# Altium footprint library ADP_SMT.PcbLib: 204 footprints (part 3 of 15)
Each footprint in its own frame and in the unit in brackets; x right, y up, seen from the top. Pads: shape width x height; smd on the part's side, far side on the other; paste and mask are expansions set on the pad; w line width, h text height; cw(c..) or ccw(c..) is an arc to the next point about the centre after c.
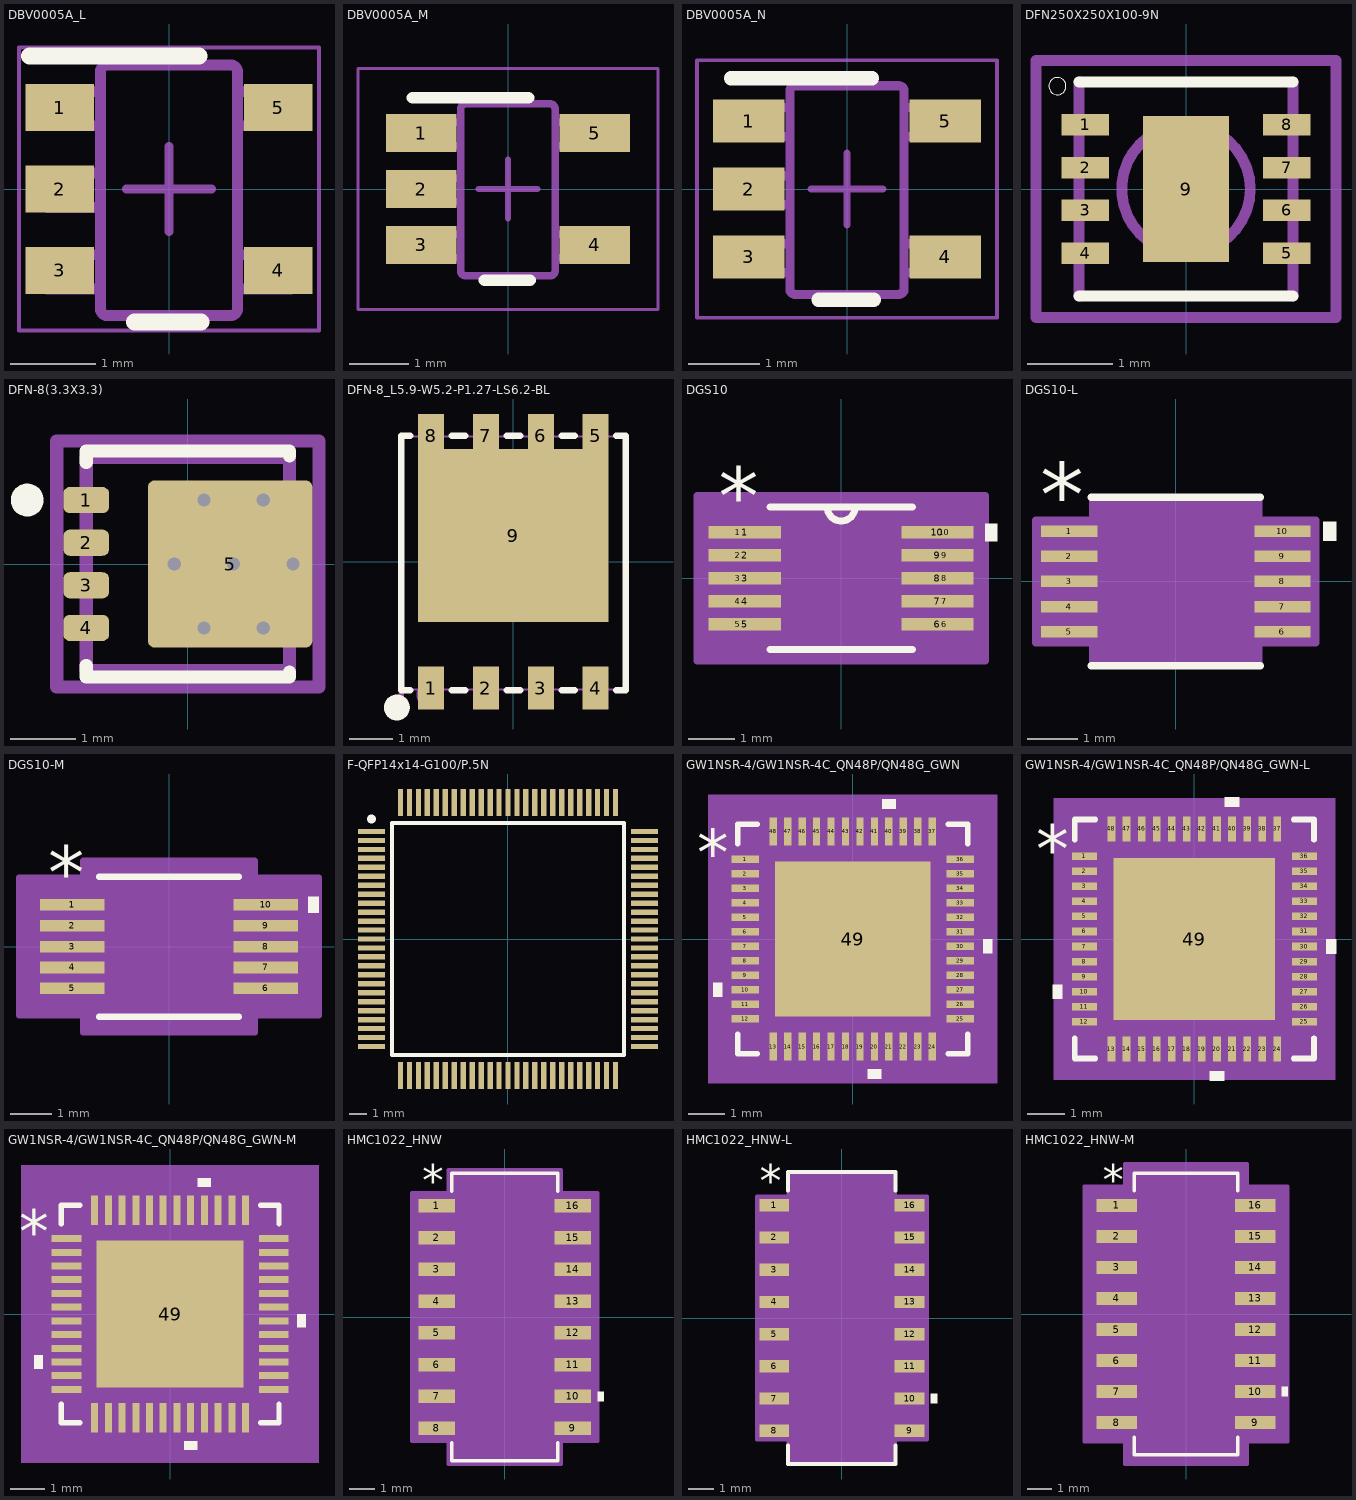
[diagram p2: the footprints below, top view; thin cyan lines are the x and y axes]

## DBV0005A_L [mm]
pads (5):
  rect 0.8x0.55 smd paste+0 mask+0.051: 1(-1.275,0.95) 2(-1.275,0) 3(-1.275,-0.95) 4(1.275,-0.95) 5(1.275,0.95)
Top Overlay:
  lines w0.2: -1.625,1.55 0.35,1.55 ; -0.4,-1.55 0.375,-1.55
Mechanical 13:
  lines w0.127: -0.801,1.371 cw(c-0.725,1.37) -0.725,1.446 ; -0.801,1.37 -0.801,-1.399 -0.801,-1.4 ccw(c-0.725,-1.399) -0.725,-1.475 ; -0.801,1.37 -0.801,1.371 ; -0.725,-1.475 -0.725,-1.475 ; -0.725,-1.475 0.723,-1.475 0.724,-1.475 ccw(c0.723,-1.399) 0.799,-1.4 0.799,-1.399 0.799,1.37 ; -0.725,1.446 0.723,1.446 0.724,1.446 cw(c0.723,1.37) 0.799,1.371 ; -0.725,1.446 -0.725,1.446 ; 0.799,1.37 0.799,1.371 ; -1.423,-1.167 -1.199,-1.167 -1.105,-1.167 -1.088,-1.167 -0.835,-1.167 -0.801,-1.167 -0.801,-0.767 -0.835,-0.767 -1.088,-0.767 -1.105,-0.767 -1.199,-0.767 -1.423,-0.767 -1.423,-1.167 ; -1.423,-0.215 -1.199,-0.215 -1.105,-0.215 -1.088,-0.215 -0.835,-0.215 -0.801,-0.215 -0.801,0.186 -0.835,0.186 -1.088,0.186 -1.105,0.186 -1.199,0.186 -1.423,0.186 -1.423,-0.215 ; -1.423,0.738 -1.199,0.738 -1.105,0.738 -1.088,0.738 -0.835,0.738 -0.801,0.738 -0.801,1.138 -0.835,1.138 -1.088,1.138 -1.105,1.138 -1.199,1.138 -1.423,1.138 -1.423,0.738 ; 0.799,-1.167 0.799,-0.767 0.834,-0.767 1.087,-0.767 1.103,-0.767 1.198,-0.767 1.422,-0.767 1.422,-1.167 1.198,-1.167 1.103,-1.167 1.087,-1.167 0.834,-1.167 0.799,-1.167 ; 0.799,0.738 0.799,1.138 0.834,1.138 1.087,1.138 1.103,1.138 1.198,1.138 1.422,1.138 1.422,0.738 1.198,0.738 1.103,0.738 1.087,0.738 0.834,0.738 0.799,0.738
Mechanical 15:
  lines w0.05: -1.75,-1.65 -1.75,1.65 1.75,1.65 1.75,-1.65 -1.75,-1.65
  lines w0.1: -0.5,0 0.5,0 ; 0,-0.5 0,0.5
3D body: height 0.25, standoff 0, extent 0,0 0.254,0.254

## DBV0005A_M [mm]
pads (5):
  rect 1.2x0.65 smd paste+0 mask+0.051: 1(-1.475,0.95) 2(-1.475,0) 3(-1.475,-0.95) 4(1.475,-0.95) 5(1.475,0.95)
Top Overlay:
  lines w0.2: -1.625,1.55 0.35,1.55 ; -0.4,-1.55 0.375,-1.55
Mechanical 13:
  lines w0.127: -0.801,1.371 cw(c-0.725,1.37) -0.725,1.446 ; -0.801,1.37 -0.801,-1.399 -0.801,-1.4 ccw(c-0.725,-1.399) -0.725,-1.475 ; -0.801,1.37 -0.801,1.371 ; -0.725,-1.475 -0.725,-1.475 ; -0.725,-1.475 0.723,-1.475 0.724,-1.475 ccw(c0.723,-1.399) 0.799,-1.4 0.799,-1.399 0.799,1.37 ; -0.725,1.446 0.723,1.446 0.724,1.446 cw(c0.723,1.37) 0.799,1.371 ; -0.725,1.446 -0.725,1.446 ; 0.799,1.37 0.799,1.371 ; -1.423,-1.167 -1.199,-1.167 -1.105,-1.167 -1.088,-1.167 -0.835,-1.167 -0.801,-1.167 -0.801,-0.767 -0.835,-0.767 -1.088,-0.767 -1.105,-0.767 -1.199,-0.767 -1.423,-0.767 -1.423,-1.167 ; -1.423,-0.215 -1.199,-0.215 -1.105,-0.215 -1.088,-0.215 -0.835,-0.215 -0.801,-0.215 -0.801,0.186 -0.835,0.186 -1.088,0.186 -1.105,0.186 -1.199,0.186 -1.423,0.186 -1.423,-0.215 ; -1.423,0.738 -1.199,0.738 -1.105,0.738 -1.088,0.738 -0.835,0.738 -0.801,0.738 -0.801,1.138 -0.835,1.138 -1.088,1.138 -1.105,1.138 -1.199,1.138 -1.423,1.138 -1.423,0.738 ; 0.799,-1.167 0.799,-0.767 0.834,-0.767 1.087,-0.767 1.103,-0.767 1.198,-0.767 1.422,-0.767 1.422,-1.167 1.198,-1.167 1.103,-1.167 1.087,-1.167 0.834,-1.167 0.799,-1.167 ; 0.799,0.738 0.799,1.138 0.834,1.138 1.087,1.138 1.103,1.138 1.198,1.138 1.422,1.138 1.422,0.738 1.198,0.738 1.103,0.738 1.087,0.738 0.834,0.738 0.799,0.738
Mechanical 15:
  lines w0.05: -2.55,-2.05 -2.55,2.05 2.55,2.05 2.55,-2.05 -2.55,-2.05
  lines w0.1: -0.5,0 0.5,0 ; 0,-0.5 0,0.5
3D body: height 0.25, standoff 0, extent 0,0 0.254,0.254

## DBV0005A_N [mm]
pads (5):
  rect 1x0.6 smd paste+0 mask+0.051: 1(-1.375,0.95) 2(-1.375,0) 3(-1.375,-0.95) 4(1.375,-0.95) 5(1.375,0.95)
Top Overlay:
  lines w0.2: -1.625,1.55 0.35,1.55 ; -0.4,-1.55 0.375,-1.55
Mechanical 13:
  lines w0.127: -0.801,1.371 cw(c-0.725,1.37) -0.725,1.446 ; -0.801,1.37 -0.801,-1.399 -0.801,-1.4 ccw(c-0.725,-1.399) -0.725,-1.475 ; -0.801,1.37 -0.801,1.371 ; -0.725,-1.475 -0.725,-1.475 ; -0.725,-1.475 0.723,-1.475 0.724,-1.475 ccw(c0.723,-1.399) 0.799,-1.4 0.799,-1.399 0.799,1.37 ; -0.725,1.446 0.723,1.446 0.724,1.446 cw(c0.723,1.37) 0.799,1.371 ; -0.725,1.446 -0.725,1.446 ; 0.799,1.37 0.799,1.371 ; -1.423,-1.167 -1.199,-1.167 -1.105,-1.167 -1.088,-1.167 -0.835,-1.167 -0.801,-1.167 -0.801,-0.767 -0.835,-0.767 -1.088,-0.767 -1.105,-0.767 -1.199,-0.767 -1.423,-0.767 -1.423,-1.167 ; -1.423,-0.215 -1.199,-0.215 -1.105,-0.215 -1.088,-0.215 -0.835,-0.215 -0.801,-0.215 -0.801,0.186 -0.835,0.186 -1.088,0.186 -1.105,0.186 -1.199,0.186 -1.423,0.186 -1.423,-0.215 ; -1.423,0.738 -1.199,0.738 -1.105,0.738 -1.088,0.738 -0.835,0.738 -0.801,0.738 -0.801,1.138 -0.835,1.138 -1.088,1.138 -1.105,1.138 -1.199,1.138 -1.423,1.138 -1.423,0.738 ; 0.799,-1.167 0.799,-0.767 0.834,-0.767 1.087,-0.767 1.103,-0.767 1.198,-0.767 1.422,-0.767 1.422,-1.167 1.198,-1.167 1.103,-1.167 1.087,-1.167 0.834,-1.167 0.799,-1.167 ; 0.799,0.738 0.799,1.138 0.834,1.138 1.087,1.138 1.103,1.138 1.198,1.138 1.422,1.138 1.422,0.738 1.198,0.738 1.103,0.738 1.087,0.738 0.834,0.738 0.799,0.738
Mechanical 15:
  lines w0.05: -2.1,-1.8 2.1,-1.8 2.1,1.8 -2.1,1.8 -2.1,-1.8
  lines w0.1: -0.5,0 0.5,0 ; 0,-0.5 0,0.5
3D body: height 0.25, standoff 0, extent 0,0 0.254,0.254

## DFN250X250X100-9N [mm]
pads (9):
  rect 0.55x0.25 smd: 1(-1.175,0.75) 2(-1.175,0.25) 3(-1.175,-0.25) 4(-1.175,-0.75) 5(1.175,-0.75) 6(1.175,-0.25) 7(1.175,0.25) 8(1.175,0.75)
  rect 1x1.7 smd paste-2: 9(0,0)
Top Overlay:
  circle w0: c-1.5,1.2 r0.1
  lines w0.127: -1.25,-1.25 1.25,-1.25 ; -1.25,1.25 1.25,1.25
Top Paste:
  region: 0.45,-0.801 -0.45,-0.801 -0.45,0.8 0.45,0.8
Mechanical 13:
  circle w0.127: c0,0 r0.75
  lines w0.127: -1.25,-1.25 -1.25,1.25 ; 1.25,-1.25 1.25,1.25
Mechanical 15:
  lines w0.127: -1.75,-1.5 -1.75,1.5 1.75,1.5 1.75,-1.5 -1.75,-1.5

## DFN-8(3.3X3.3) [mm]
height 16.9
pads (5):
  rrect50% 0.7x0.4 smd paste-1000 mask-1000: 1(-1.55,0.975) 2(-1.55,0.325) 3(-1.55,-0.325) 4(-1.55,-0.975)
  rrect8% 2.51x2.55 smd paste-1000 mask-1000: 5(0.645,0)
via 1.603,0 diameter 0.5 hole 0.2
via 0.698,0 diameter 0.5 hole 0.2
via 1.15,0.975 diameter 0.5 hole 0.2
via 1.15,-0.975 diameter 0.5 hole 0.2
via 0.245,-0.975 diameter 0.5 hole 0.2
via 0.245,0.975 diameter 0.5 hole 0.2
via -0.207,0 diameter 0.5 hole 0.2
Top Overlay:
  circle w0.25: c-2.45,0.975 r0.125
  lines w0.2: -1.55,-1.55 -1.55,-1.725 1.55,-1.725 1.55,-1.65 ; -1.55,1.55 -1.55,1.725 1.55,1.725 1.55,1.65
Top Paste:
  drawing of 12 lines, arcs and shapes, not listed
Top Solder:
  drawing of 5 lines, arcs and shapes, not listed
Top 3D Body:
  lines w0.2: -1.55,-1.625 -1.55,1.625 1.55,1.625 1.55,-1.625 -1.55,-1.625
Top Component Center:
  lines w0.1: -0.5,0 0.5,0 ; 0,-0.5 0,0.5
Top Courtyard:
  lines w0.2: -2,-1.875 -2,1.875 2,1.875 2,-1.875 -2,-1.875
Top Assembly:
  lines w0.2: -2,-1.875 -2,1.875 2,1.875 2,-1.875 -2,-1.875
3D body "Trans_Texas_Instruments_CSD18543Q3AT_eec.STEP": height 0.9, standoff 0, extent -1.65,-1.655 1.65,1.655

## DFN-8_L5.9-W5.2-P1.27-LS6.2-BL [mm]
pads (9):
  rect 0.6x1 smd paste-100 mask+0.05: 1(-1.905,-2.925) 2(-0.635,-2.925) 3(0.635,-2.925) 4(1.905,-2.925) 5(1.905,2.925) 6(0.635,2.925) 7(-0.635,2.925) 8(-1.905,2.925)
  rect 4.41x4 smd paste-100 mask+0.05: 9(0,0.61)
Top Overlay:
  circle w0.3: c-2.7,-3.375 r0.15
  lines w0.152: -2.385,-2.975 -2.6,-2.975 -2.6,2.925 -2.385,2.925 ; -1.425,-2.975 -1.115,-2.975 ; -1.425,2.925 -1.115,2.925 ; -0.155,-2.975 0.155,-2.975 ; -0.155,2.925 0.155,2.925 ; 1.115,-2.975 1.425,-2.975 ; 1.115,2.925 1.425,2.925 ; 2.385,-2.975 2.6,-2.975 2.6,2.925 2.385,2.925
Top Paste:
  region: -2.205,-3.425 -1.605,-3.425 -1.605,-2.425 -2.205,-2.425
  region: -0.935,-3.425 -0.335,-3.425 -0.335,-2.425 -0.935,-2.425
  region: 0.335,-3.425 0.935,-3.425 0.935,-2.425 0.335,-2.425
  region: 1.605,-3.425 2.205,-3.425 2.205,-2.425 1.605,-2.425
  region: 2.205,3.425 1.605,3.425 1.605,2.61 0.935,2.61 0.935,3.425 0.335,3.425 0.335,2.61 -0.335,2.61 -0.335,3.425 -0.935,3.425 -0.935,2.61 -1.605,2.61 -1.605,3.425 -2.205,3.425 -2.205,-1.39 2.205,-1.39
Mechanical 6:
  circle w0.3: c-1.95,-3.075 r0.15
Mechanical 15:
  region: -2.125,-1.27 -2.125,2.55 2.125,2.55 2.125,-1.27
  region: -2.105,-2.475 -1.705,-2.475 -1.705,-3.075 -2.105,-3.075
  region: -0.835,-2.475 -0.435,-2.475 -0.435,-3.075 -0.835,-3.075
  region: 0.435,-2.475 0.835,-2.475 0.835,-3.075 0.435,-3.075
  region: 1.705,-2.475 2.105,-2.475 2.105,-3.075 1.705,-3.075
  region: 1.705,3.075 2.105,3.075 2.105,2.475 1.705,2.475
  region: 0.435,3.075 0.835,3.075 0.835,2.475 0.435,2.475
  region: -0.835,3.075 -0.435,3.075 -0.435,2.475 -0.835,2.475
  region: -2.105,3.075 -1.705,3.075 -1.705,2.475 -2.105,2.475
  region: -2.54,-3.075 -2.54,-3.05 -2.575,-3.015 -2.625,-3.015 -2.66,-3.05 -2.66,-3.075 -2.66,-3.1 -2.625,-3.135 -2.575,-3.135 -2.54,-3.1 -2.54,-3.075
  lines w0.051: -2.6,-2.955 2.6,-2.955 2.6,2.905 -2.6,2.905 -2.6,-2.955

## DGS10 [mil]
pads (20):
  rect 44x9 smd paste+0 mask+0: 1(-88.5,39.37) 2(-88.5,19.68) 3(-88.5,0) 4(-88.5,-19.68) 5(-88.5,-39.37) 6(88.5,-39.37) 7(88.5,-19.68) 8(88.5,0) 9(88.5,19.68) 10(88.5,39.37)
  rect 62x11 smd paste-31 mask-31: 1(-82.5,39.37) 2(-82.5,19.68) 3(-82.5,0) 4(-82.5,-19.68) 5(-82.5,-39.37) 6(82.5,-39.37) 7(82.5,-19.68) 8(82.5,0) 9(82.5,19.68) 10(82.5,39.37)
Top Overlay:
  region: 123.5,46.87 133.5,46.87 133.5,31.87 123.5,31.87
  lines w6: -61,-61 61,-61 ; -61,61 61,61 ; -12,61 ccw(c0,61) 12,61
  text "*" at -105,45.37 h50
Mechanical 13:
  lines w0: -12,61 ccw(c0,61) 12,61
  lines w1: -99.5,-44.87 -99.5,-33.87 -61,-33.87 -61,-44.87 -99.5,-44.87 ; -99.5,-25.18 -99.5,-14.19 -61,-14.19 -61,-25.18 -99.5,-25.18 ; -99.5,-5.5 -99.5,5.5 -61,5.5 -61,-5.5 -99.5,-5.5 ; -99.5,14.19 -99.5,25.18 -61,25.18 -61,14.19 -99.5,14.19 ; -99.5,33.87 -99.5,44.87 -61,44.87 -61,33.87 -99.5,33.87 ; -61,-61 61,-61 61,61 -61,61 -61,-61 ; 61,-44.87 61,-33.87 99.5,-33.87 99.5,-44.87 61,-44.87 ; 61,-25.18 61,-14.19 99.5,-14.19 99.5,-25.18 61,-25.18 ; 61,-5.5 61,5.5 99.5,5.5 99.5,-5.5 61,-5.5 ; 61,14.19 61,25.18 99.5,25.18 99.5,14.19 61,14.19 ; 61,33.87 61,44.87 99.5,44.87 99.5,33.87 61,33.87
  text "*" at -105,45.37 h50
Mechanical 15:
  region: 123.5,-71 -123.5,-71 -123.5,71 123.5,71
  lines w6: -123.5,-71 -123.5,71 123.5,71 123.5,-71 -123.5,-71
3D body "DGS10.step": height 43.11, standoff 0, extent -99.49,-60.98 99.49,60.98

## DGS10-L [mil]
pads (10):
  rect 44x9 smd paste+0 mask+0: 1(-83.5,39.37) 2(-83.5,19.68) 3(-83.5,0) 4(-83.5,-19.68) 5(-83.5,-39.37) 6(83.5,-39.37) 7(83.5,-19.68) 8(83.5,0) 9(83.5,19.68) 10(83.5,39.37)
Top Overlay:
  region: 115.5,46.87 125.5,46.87 125.5,31.87 115.5,31.87
  lines w6: -66,-66 66,-66 ; -66,66 66,66
  text "*" at -106,43.37 h50
Mechanical 13:
  lines w0: -12,61 ccw(c0,61) 12,61
  lines w1: -99.5,-44.87 -99.5,-33.87 -61,-33.87 -61,-44.87 -99.5,-44.87 ; -99.5,-25.18 -99.5,-14.19 -61,-14.19 -61,-25.18 -99.5,-25.18 ; -99.5,-5.5 -99.5,5.5 -61,5.5 -61,-5.5 -99.5,-5.5 ; -99.5,14.19 -99.5,25.18 -61,25.18 -61,14.19 -99.5,14.19 ; -99.5,33.87 -99.5,44.87 -61,44.87 -61,33.87 -99.5,33.87 ; -61,-61 61,-61 61,61 -61,61 -61,-61 ; 61,-44.87 61,-33.87 99.5,-33.87 99.5,-44.87 61,-44.87 ; 61,-25.18 61,-14.19 99.5,-14.19 99.5,-25.18 61,-25.18 ; 61,-5.5 61,5.5 99.5,5.5 99.5,-5.5 61,-5.5 ; 61,14.19 61,25.18 99.5,25.18 99.5,14.19 61,14.19 ; 61,33.87 61,44.87 99.5,44.87 99.5,33.87 61,33.87
  text "*" at -58.5,8 h50
Mechanical 15:
  region: -65,-47.87 -109.5,-47.87 -109.5,47.87 -65,47.87 -65,65 65,65 65,47.87 109.5,47.87 109.5,-47.87 65,-47.87 65,-65 -65,-65
  lines w6: -109.5,-47.87 -109.5,47.87 -65,47.87 -65,65 65,65 65,47.87 109.5,47.87 109.5,-47.87 65,-47.87 65,-65 -65,-65 -65,-47.87 -109.5,-47.87
3D body "DGS10.step": height 43.11, standoff 0, extent -99.49,-60.98 99.49,60.98

## DGS10-M [mil]
pads (10):
  rect 60.5x11 smd paste+0 mask+0: 1(-91.25,39.37) 2(-91.25,19.68) 3(-91.25,0) 4(-91.25,-19.68) 5(-91.25,-39.37) 6(91.25,-39.37) 7(91.25,-19.68) 8(91.25,0) 9(91.25,19.68) 10(91.25,39.37)
Top Overlay:
  region: 131.5,46.87 141.5,46.87 141.5,31.87 131.5,31.87
  lines w6: -66,-66 66,-66 ; -66,66 66,66
  text "*" at -113.75,45.37 h50
Mechanical 13:
  lines w0: -12,61 ccw(c0,61) 12,61
  lines w1: -99.5,-44.87 -99.5,-33.87 -61,-33.87 -61,-44.87 -99.5,-44.87 ; -99.5,-25.18 -99.5,-14.19 -61,-14.19 -61,-25.18 -99.5,-25.18 ; -99.5,-5.5 -99.5,5.5 -61,5.5 -61,-5.5 -99.5,-5.5 ; -99.5,14.19 -99.5,25.18 -61,25.18 -61,14.19 -99.5,14.19 ; -99.5,33.87 -99.5,44.87 -61,44.87 -61,33.87 -99.5,33.87 ; -61,-61 61,-61 61,61 -61,61 -61,-61 ; 61,-44.87 61,-33.87 99.5,-33.87 99.5,-44.87 61,-44.87 ; 61,-25.18 61,-14.19 99.5,-14.19 99.5,-25.18 61,-25.18 ; 61,-5.5 61,5.5 99.5,5.5 99.5,-5.5 61,-5.5 ; 61,14.19 61,25.18 99.5,25.18 99.5,14.19 61,14.19 ; 61,33.87 61,44.87 99.5,44.87 99.5,33.87 61,33.87
  text "*" at -58.5,8 h50
Mechanical 15:
  region: -81,-64.87 -141.5,-64.87 -141.5,64.87 -81,64.87 -81,81 81,81 81,64.87 141.5,64.87 141.5,-64.87 81,-64.87 81,-81 -81,-81
  lines w6: -141.5,-64.87 -141.5,64.87 -81,64.87 -81,81 81,81 81,64.87 141.5,64.87 141.5,-64.87 81,-64.87 81,-81 -81,-81 -81,-64.87 -141.5,-64.87
3D body "DGS10.step": height 43.11, standoff 0, extent -99.49,-60.98 99.49,60.98

## F-QFP14x14-G100/P.5N [mm] "QFP; 100 Leads; Body 14 x 14 mm; Pitch 0.5 mm"
height 1.7
pads (100):
  rect 1.5x0.3 smd: 1(-7.625,6) 2(-7.625,5.5) 3(-7.625,5) 4(-7.625,4.5) 5(-7.625,4) 6(-7.625,3.5) 7(-7.625,3) 8(-7.625,2.5) 9(-7.625,2) 10(-7.625,1.5) 11(-7.625,1) 12(-7.625,0.5) 13(-7.625,0) 14(-7.625,-0.5) 15(-7.625,-1) 16(-7.625,-1.5) 17(-7.625,-2) 18(-7.625,-2.5) 19(-7.625,-3) 20(-7.625,-3.5) 21(-7.625,-4) 22(-7.625,-4.5) 23(-7.625,-5) 24(-7.625,-5.5) 25(-7.625,-6) 51(7.625,-6) 52(7.625,-5.5) 53(7.625,-5) 54(7.625,-4.5) 55(7.625,-4) 56(7.625,-3.5) 57(7.625,-3) 58(7.625,-2.5) 59(7.625,-2) 60(7.625,-1.5) 61(7.625,-1) 62(7.625,-0.5) 63(7.625,0) 64(7.625,0.5) 65(7.625,1) 66(7.625,1.5) 67(7.625,2) 68(7.625,2.5) 69(7.625,3) 70(7.625,3.5) 71(7.625,4) 72(7.625,4.5) 73(7.625,5) 74(7.625,5.5) 75(7.625,6)
  rect 0.3x1.5 smd: 26(-6,-7.625) 27(-5.5,-7.625) 28(-5,-7.625) 29(-4.5,-7.625) 30(-4,-7.625) 31(-3.5,-7.625) 32(-3,-7.625) 33(-2.5,-7.625) 34(-2,-7.625) 35(-1.5,-7.625) 36(-1,-7.625) 37(-0.5,-7.625) 38(0,-7.625) 39(0.5,-7.625) 40(1,-7.625) 41(1.5,-7.625) 42(2,-7.625) 43(2.5,-7.625) 44(3,-7.625) 45(3.5,-7.625) 46(4,-7.625) 47(4.5,-7.625) 48(5,-7.625) 49(5.5,-7.625) 50(6,-7.625) 76(6,7.625) 77(5.5,7.625) 78(5,7.625) 79(4.5,7.625) 80(4,7.625) 81(3.5,7.625) 82(3,7.625) 83(2.5,7.625) 84(2,7.625) 85(1.5,7.625) 86(1,7.625) 87(0.5,7.625) 88(0,7.625) 89(-0.5,7.625) 90(-1,7.625) 91(-1.5,7.625) 92(-2,7.625) 93(-2.5,7.625) 94(-3,7.625) 95(-3.5,7.625) 96(-4,7.625) 97(-4.5,7.625) 98(-5,7.625) 99(-5.5,7.625) 100(-6,7.625)
Top Overlay:
  circle w0.25: c-7.625,6.7 r0.125
  lines w0.2: -6.475,-6.475 -6.475,6.475 6.475,6.475 6.475,-6.475 -6.475,-6.475
3D body "stm32h750vbt6.x_t": height 1.48, standoff 0, extent -8.002,-7.998 7.998,8.002

## GW1NSR-4/GW1NSR-4C_QN48P/QN48G_GWN [mil]
pads (49):
  rect 30x8 smd paste+0 mask+0: 1(-117,86.61) 2(-117,70.87) 3(-117,55.12) 4(-117,39.37) 5(-117,23.62) 6(-117,7.87) 7(-117,-7.87) 8(-117,-23.62) 9(-117,-39.37) 10(-117,-55.12) 11(-117,-70.87) 12(-117,-86.61) 25(117,-86.61) 26(117,-70.87) 27(117,-55.12) 28(117,-39.37) 29(117,-23.62) 30(117,-7.87) 31(117,7.87) 32(117,23.62) 33(117,39.37) 34(117,55.12) 35(117,70.87) 36(117,86.61)
  rect 8x30 smd paste+0 mask+0: 13(-86.61,-117) 14(-70.87,-117) 15(-55.12,-117) 16(-39.37,-117) 17(-23.62,-117) 18(-7.87,-117) 19(7.87,-117) 20(23.62,-117) 21(39.37,-117) 22(55.12,-117) 23(70.87,-117) 24(86.61,-117) 37(86.61,117) 38(70.87,117) 39(55.12,117) 40(39.37,117) 41(23.62,117) 42(7.87,117) 43(-7.87,117) 44(-23.62,117) 45(-39.37,117) 46(-55.12,117) 47(-70.87,117) 48(-86.61,117)
  rect 169x169 smd paste-84 mask+0: 49(0,0)
Top Overlay:
  region: 46.87,142 31.87,142 31.87,152 46.87,152
  region: 142,-0.37 152,-0.37 152,-15.37 142,-15.37
  region: 31.12,-142 16.12,-142 16.12,-152 31.12,-152
  region: -142,-47.62 -152,-47.62 -152,-62.62 -142,-62.62
  lines w6: -125,-103.71 -125,-125 -103.71,-125 ; -125,103.71 -125,125 -103.71,125 ; 103.71,-125 125,-125 125,-103.71 ; 103.71,125 125,125 125,103.71
  text "*" at -169.5,69.49 h50
Top Paste:
  region: 80.56,-32.1 32.1,-32.1 32.1,-80.56 80.56,-80.56
  region: 80.56,24.23 32.1,24.23 32.1,-24.23 80.56,-24.23
  region: 80.56,80.56 32.1,80.56 32.1,32.1 80.56,32.1
  region: 24.23,-32.1 -24.23,-32.1 -24.23,-80.56 24.23,-80.56
  region: 24.23,24.23 -24.23,24.23 -24.23,-24.23 24.23,-24.23
  region: 24.23,80.56 -24.23,80.56 -24.23,32.1 24.23,32.1
  region: -32.1,-32.1 -80.56,-32.1 -80.56,-80.56 -32.1,-80.56
  region: -32.1,24.23 -80.56,24.23 -80.56,-24.23 -32.1,-24.23
  region: -32.1,80.56 -80.56,80.56 -80.56,32.1 -32.1,32.1
Mechanical 5:
  region: 157,-157 -157,-157 -157,157 157,157
Mechanical 13:
  lines w1: -120,70 -70,120 ; -120,-120 -120,120 120,120 120,-120 -120,-120 ; -120,-91.61 -120,-81.61 -120,-91.61 ; -120,-75.87 -120,-65.87 -120,-75.87 ; -120,-60.12 -120,-50.12 -120,-60.12 ; -120,-44.37 -120,-34.37 -120,-44.37 ; -120,-28.62 -120,-18.62 -120,-28.62 ; -120,-12.87 -120,-2.87 -120,-12.87 ; -120,2.87 -120,12.87 -120,2.87 ; -120,18.62 -120,28.62 -120,18.62 ; -120,34.37 -120,44.37 -120,34.37 ; -120,50.12 -120,60.12 -120,50.12 ; -120,65.87 -120,75.87 -120,65.87 ; -120,81.61 -120,91.61 -120,81.61 ; -91.61,-120 -81.61,-120 -91.61,-120 ; -91.61,120 -81.61,120 -91.61,120 ; -75.87,-120 -65.87,-120 -75.87,-120 ; -75.87,120 -65.87,120 -75.87,120 ; -60.12,-120 -50.12,-120 -60.12,-120 ; -60.12,120 -50.12,120 -60.12,120 ; -44.37,-120 -34.37,-120 -44.37,-120 ; -44.37,120 -34.37,120 -44.37,120 ; -28.62,-120 -18.62,-120 -28.62,-120 ; -28.62,120 -18.62,120 -28.62,120 ; -12.87,-120 -2.87,-120 -12.87,-120 ; -12.87,120 -2.87,120 -12.87,120 ; 2.87,-120 12.87,-120 2.87,-120 ; 2.87,120 12.87,120 2.87,120 ; 18.62,-120 28.62,-120 18.62,-120 ; 18.62,120 28.62,120 18.62,120 ; 34.37,-120 44.37,-120 34.37,-120 ; 34.37,120 44.37,120 34.37,120 ; 50.12,-120 60.12,-120 50.12,-120 ; 50.12,120 60.12,120 50.12,120 ; 65.87,-120 75.87,-120 65.87,-120 ; 65.87,120 75.87,120 65.87,120 ; 81.61,-120 91.61,-120 81.61,-120 ; 81.61,120 91.61,120 81.61,120 ; 120,-91.61 120,-81.61 120,-91.61 ; 120,-75.87 120,-65.87 120,-75.87 ; 120,-60.12 120,-50.12 120,-60.12 ; 120,-44.37 120,-34.37 120,-44.37 ; 120,-28.62 120,-18.62 120,-28.62 ; 120,-12.87 120,-2.87 120,-12.87 ; 120,2.87 120,12.87 120,2.87 ; 120,18.62 120,28.62 120,18.62 ; 120,34.37 120,44.37 120,34.37 ; 120,50.12 120,60.12 120,50.12 ; 120,65.87 120,75.87 120,65.87 ; 120,81.61 120,91.61 120,81.61
  text "*" at -114.5,69.49 h50
Mechanical 15:
  region: -100.61,-130 -130,-130 -130,-100.61 -142,-100.61 -142,100.61 -130,100.61 -130,130 -100.61,130 -100.61,142 100.61,142 100.61,130 130,130 130,100.61 142,100.61 142,-100.61 130,-100.61 130,-130 100.61,-130 100.61,-142 -100.61,-142
  lines w6: -142,-100.61 -142,100.61 -130,100.61 -130,130 -100.61,130 -100.61,142 100.61,142 100.61,130 130,130 130,100.61 142,100.61 142,-100.61 130,-100.61 130,-130 100.61,-130 100.61,-142 -100.61,-142 -100.61,-130 -130,-130 -130,-100.61 -142,-100.61
3D body: height 10, standoff 0, extent 0,0 10,10

## GW1NSR-4/GW1NSR-4C_QN48P/QN48G_GWN-L [mil]
pads (49):
  rect 26x8 smd paste+0 mask+0: 1(-115,86.61) 2(-115,70.87) 3(-115,55.12) 4(-115,39.37) 5(-115,23.62) 6(-115,7.87) 7(-115,-7.87) 8(-115,-23.62) 9(-115,-39.37) 10(-115,-55.12) 11(-115,-70.87) 12(-115,-86.61) 25(115,-86.61) 26(115,-70.87) 27(115,-55.12) 28(115,-39.37) 29(115,-23.62) 30(115,-7.87) 31(115,7.87) 32(115,23.62) 33(115,39.37) 34(115,55.12) 35(115,70.87) 36(115,86.61)
  rect 8x26 smd paste+0 mask+0: 13(-86.61,-115) 14(-70.87,-115) 15(-55.12,-115) 16(-39.37,-115) 17(-23.62,-115) 18(-7.87,-115) 19(7.87,-115) 20(23.62,-115) 21(39.37,-115) 22(55.12,-115) 23(70.87,-115) 24(86.61,-115) 37(86.61,115) 38(70.87,115) 39(55.12,115) 40(39.37,115) 41(23.62,115) 42(7.87,115) 43(-7.87,115) 44(-23.62,115) 45(-39.37,115) 46(-55.12,115) 47(-70.87,115) 48(-86.61,115)
  rect 169x169 smd paste-84 mask+0: 49(0,0)
Top Overlay:
  region: -138,-47.62 -148,-47.62 -148,-62.62 -138,-62.62
  region: 31.12,-138 16.12,-138 16.12,-148 31.12,-148
  region: 138,-0.37 148,-0.37 148,-15.37 138,-15.37
  region: 46.87,138 31.87,138 31.87,148 46.87,148
  lines w6: -125,-103.71 -125,-125 -103.71,-125 ; -125,103.71 -125,125 -103.71,125 ; 103.71,-125 125,-125 125,-103.71 ; 103.71,125 125,125 125,103.71
  text "*" at -165.5,69.49 h50
Top Paste:
  region: -32.1,80.56 -80.56,80.56 -80.56,32.1 -32.1,32.1
  region: -32.1,24.23 -80.56,24.23 -80.56,-24.23 -32.1,-24.23
  region: -32.1,-32.1 -80.56,-32.1 -80.56,-80.56 -32.1,-80.56
  region: 24.23,80.56 -24.23,80.56 -24.23,32.1 24.23,32.1
  region: 24.23,24.23 -24.23,24.23 -24.23,-24.23 24.23,-24.23
  region: 24.23,-32.1 -24.23,-32.1 -24.23,-80.56 24.23,-80.56
  region: 80.56,80.56 32.1,80.56 32.1,32.1 80.56,32.1
  region: 80.56,24.23 32.1,24.23 32.1,-24.23 80.56,-24.23
  region: 80.56,-32.1 32.1,-32.1 32.1,-80.56 80.56,-80.56
Mechanical 5:
  region: 147,-147 -147,-147 -147,147 147,147
Mechanical 13:
  lines w1: -120,70 -70,120 ; -120,-120 120,-120 120,120 -120,120 -120,-120 ; -120,-91.61 -120,-81.61 -120,-91.61 ; -120,-75.87 -120,-65.87 -120,-75.87 ; -120,-60.12 -120,-50.12 -120,-60.12 ; -120,-44.37 -120,-34.37 -120,-44.37 ; -120,-28.62 -120,-18.62 -120,-28.62 ; -120,-12.87 -120,-2.87 -120,-12.87 ; -120,2.87 -120,12.87 -120,2.87 ; -120,18.62 -120,28.62 -120,18.62 ; -120,34.37 -120,44.37 -120,34.37 ; -120,50.12 -120,60.12 -120,50.12 ; -120,65.87 -120,75.87 -120,65.87 ; -120,81.61 -120,91.61 -120,81.61 ; -91.61,-120 -81.61,-120 -91.61,-120 ; -91.61,120 -81.61,120 -91.61,120 ; -75.87,-120 -65.87,-120 -75.87,-120 ; -75.87,120 -65.87,120 -75.87,120 ; -60.12,-120 -50.12,-120 -60.12,-120 ; -60.12,120 -50.12,120 -60.12,120 ; -44.37,-120 -34.37,-120 -44.37,-120 ; -44.37,120 -34.37,120 -44.37,120 ; -28.62,-120 -18.62,-120 -28.62,-120 ; -28.62,120 -18.62,120 -28.62,120 ; -12.87,-120 -2.87,-120 -12.87,-120 ; -12.87,120 -2.87,120 -12.87,120 ; 2.87,-120 12.87,-120 2.87,-120 ; 2.87,120 12.87,120 2.87,120 ; 18.62,-120 28.62,-120 18.62,-120 ; 18.62,120 28.62,120 18.62,120 ; 34.37,-120 44.37,-120 34.37,-120 ; 34.37,120 44.37,120 34.37,120 ; 50.12,-120 60.12,-120 50.12,-120 ; 50.12,120 60.12,120 50.12,120 ; 65.87,-120 75.87,-120 65.87,-120 ; 65.87,120 75.87,120 65.87,120 ; 81.61,-120 91.61,-120 81.61,-120 ; 81.61,120 91.61,120 81.61,120 ; 120,-91.61 120,-81.61 120,-91.61 ; 120,-75.87 120,-65.87 120,-75.87 ; 120,-60.12 120,-50.12 120,-60.12 ; 120,-44.37 120,-34.37 120,-44.37 ; 120,-28.62 120,-18.62 120,-28.62 ; 120,-12.87 120,-2.87 120,-12.87 ; 120,2.87 120,12.87 120,2.87 ; 120,18.62 120,28.62 120,18.62 ; 120,34.37 120,44.37 120,34.37 ; 120,50.12 120,60.12 120,50.12 ; 120,65.87 120,75.87 120,65.87 ; 120,81.61 120,91.61 120,81.61
  text "*" at -114.5,69.49 h50
Mechanical 15:
  region: -94.61,-124 -124,-124 -124,-94.61 -132,-94.61 -132,94.61 -124,94.61 -124,124 -94.61,124 -94.61,132 94.61,132 94.61,124 124,124 124,94.61 132,94.61 132,-94.61 124,-94.61 124,-124 94.61,-124 94.61,-132 -94.61,-132
  lines w6: -132,-94.61 -124,-94.61 -124,-124 -94.61,-124 -94.61,-132 94.61,-132 94.61,-124 124,-124 124,-94.61 132,-94.61 132,94.61 124,94.61 124,124 94.61,124 94.61,132 -94.61,132 -94.61,124 -124,124 -124,94.61 -132,94.61 -132,-94.61
3D body: height 10, standoff 0, extent 0,0 10,10

## GW1NSR-4/GW1NSR-4C_QN48P/QN48G_GWN-M [mil]
pads (49):
  rect 34x8 smd paste+0 mask+0: 1(-119,86.61) 2(-119,70.87) 3(-119,55.12) 4(-119,39.37) 5(-119,23.62) 6(-119,7.87) 7(-119,-7.87) 8(-119,-23.62) 9(-119,-39.37) 10(-119,-55.12) 11(-119,-70.87) 12(-119,-86.61) 25(119,-86.61) 26(119,-70.87) 27(119,-55.12) 28(119,-39.37) 29(119,-23.62) 30(119,-7.87) 31(119,7.87) 32(119,23.62) 33(119,39.37) 34(119,55.12) 35(119,70.87) 36(119,86.61)
  rect 8x34 smd paste+0 mask+0: 13(-86.61,-119) 14(-70.87,-119) 15(-55.12,-119) 16(-39.37,-119) 17(-23.62,-119) 18(-7.87,-119) 19(7.87,-119) 20(23.62,-119) 21(39.37,-119) 22(55.12,-119) 23(70.87,-119) 24(86.61,-119) 37(86.61,119) 38(70.87,119) 39(55.12,119) 40(39.37,119) 41(23.62,119) 42(7.87,119) 43(-7.87,119) 44(-23.62,119) 45(-39.37,119) 46(-55.12,119) 47(-70.87,119) 48(-86.61,119)
  rect 169x169 smd paste-84 mask+0: 49(0,0)
Top Overlay:
  region: -146,-47.62 -156,-47.62 -156,-62.62 -146,-62.62
  region: 31.12,-146 16.12,-146 16.12,-156 31.12,-156
  region: 146,-0.37 156,-0.37 156,-15.37 146,-15.37
  region: 46.87,146 31.87,146 31.87,156 46.87,156
  lines w6: -125,-103.71 -125,-125 -103.71,-125 ; -125,103.71 -125,125 -103.71,125 ; 103.71,-125 125,-125 125,-103.71 ; 103.71,125 125,125 125,103.71
  text "*" at -173.5,69.49 h50
Top Paste:
  region: -32.1,80.56 -80.56,80.56 -80.56,32.1 -32.1,32.1
  region: -32.1,24.23 -80.56,24.23 -80.56,-24.23 -32.1,-24.23
  region: -32.1,-32.1 -80.56,-32.1 -80.56,-80.56 -32.1,-80.56
  region: 24.23,80.56 -24.23,80.56 -24.23,32.1 24.23,32.1
  region: 24.23,24.23 -24.23,24.23 -24.23,-24.23 24.23,-24.23
  region: 24.23,-32.1 -24.23,-32.1 -24.23,-80.56 24.23,-80.56
  region: 80.56,80.56 32.1,80.56 32.1,32.1 80.56,32.1
  region: 80.56,24.23 32.1,24.23 32.1,-24.23 80.56,-24.23
  region: 80.56,-32.1 32.1,-32.1 32.1,-80.56 80.56,-80.56
Mechanical 5:
  region: 171,-171 -171,-171 -171,171 171,171
Mechanical 13:
  lines w1: -120,70 -70,120 ; -120,-120 120,-120 120,120 -120,120 -120,-120 ; -120,-91.61 -120,-81.61 -120,-91.61 ; -120,-75.87 -120,-65.87 -120,-75.87 ; -120,-60.12 -120,-50.12 -120,-60.12 ; -120,-44.37 -120,-34.37 -120,-44.37 ; -120,-28.62 -120,-18.62 -120,-28.62 ; -120,-12.87 -120,-2.87 -120,-12.87 ; -120,2.87 -120,12.87 -120,2.87 ; -120,18.62 -120,28.62 -120,18.62 ; -120,34.37 -120,44.37 -120,34.37 ; -120,50.12 -120,60.12 -120,50.12 ; -120,65.87 -120,75.87 -120,65.87 ; -120,81.61 -120,91.61 -120,81.61 ; -91.61,-120 -81.61,-120 -91.61,-120 ; -91.61,120 -81.61,120 -91.61,120 ; -75.87,-120 -65.87,-120 -75.87,-120 ; -75.87,120 -65.87,120 -75.87,120 ; -60.12,-120 -50.12,-120 -60.12,-120 ; -60.12,120 -50.12,120 -60.12,120 ; -44.37,-120 -34.37,-120 -44.37,-120 ; -44.37,120 -34.37,120 -44.37,120 ; -28.62,-120 -18.62,-120 -28.62,-120 ; -28.62,120 -18.62,120 -28.62,120 ; -12.87,-120 -2.87,-120 -12.87,-120 ; -12.87,120 -2.87,120 -12.87,120 ; 2.87,-120 12.87,-120 2.87,-120 ; 2.87,120 12.87,120 2.87,120 ; 18.62,-120 28.62,-120 18.62,-120 ; 18.62,120 28.62,120 18.62,120 ; 34.37,-120 44.37,-120 34.37,-120 ; 34.37,120 44.37,120 34.37,120 ; 50.12,-120 60.12,-120 50.12,-120 ; 50.12,120 60.12,120 50.12,120 ; 65.87,-120 75.87,-120 65.87,-120 ; 65.87,120 75.87,120 65.87,120 ; 81.61,-120 91.61,-120 81.61,-120 ; 81.61,120 91.61,120 81.61,120 ; 120,-91.61 120,-81.61 120,-91.61 ; 120,-75.87 120,-65.87 120,-75.87 ; 120,-60.12 120,-50.12 120,-60.12 ; 120,-44.37 120,-34.37 120,-44.37 ; 120,-28.62 120,-18.62 120,-28.62 ; 120,-12.87 120,-2.87 120,-12.87 ; 120,2.87 120,12.87 120,2.87 ; 120,18.62 120,28.62 120,18.62 ; 120,34.37 120,44.37 120,34.37 ; 120,50.12 120,60.12 120,50.12 ; 120,65.87 120,75.87 120,65.87 ; 120,81.61 120,91.61 120,81.61
  text "*" at -114.5,69.49 h50
Mechanical 15:
  region: -110.61,-140 -140,-140 -140,-110.61 -156,-110.61 -156,110.61 -140,110.61 -140,140 -110.61,140 -110.61,156 110.61,156 110.61,140 140,140 140,110.61 156,110.61 156,-110.61 140,-110.61 140,-140 110.61,-140 110.61,-156 -110.61,-156
  lines w6: -156,-110.61 -140,-110.61 -140,-140 -110.61,-140 -110.61,-156 110.61,-156 110.61,-140 140,-140 140,-110.61 156,-110.61 156,110.61 140,110.61 140,140 110.61,140 110.61,156 -110.61,156 -110.61,140 -140,140 -140,110.61 -156,110.61 -156,-110.61
3D body: height 10, standoff 0, extent 0,0 10,10

## HMC1022_HNW [mil]
pads (16):
  rect 57.5x21 smd paste+0 mask+0: 1(-107.25,175) 2(-107.25,125) 3(-107.25,75) 4(-107.25,25) 5(-107.25,-25) 6(-107.25,-75) 7(-107.25,-125) 8(-107.25,-175) 9(107.25,-175) 10(107.25,-125) 11(107.25,-75) 12(107.25,-25) 13(107.25,25) 14(107.25,75) 15(107.25,125) 16(107.25,175)
Top Overlay:
  region: 146,-117.5 156,-117.5 156,-132.5 146,-132.5
  lines w6: -83.5,-198.6 -83.5,-226.5 83.5,-226.5 83.5,-198.6 ; -83.5,198.6 -83.5,226.5 83.5,226.5 83.5,198.6
  text "*" at -129.75,191 h50
Mechanical 13:
  lines w0: -12,221.5 ccw(c0,221.5) 12,221.5
  lines w1: -122,-184.5 -122,-165.5 -78.5,-165.5 -78.5,-184.5 -122,-184.5 ; -122,-134.5 -122,-115.5 -78.5,-115.5 -78.5,-134.5 -122,-134.5 ; -122,-84.5 -122,-65.5 -78.5,-65.5 -78.5,-84.5 -122,-84.5 ; -122,-34.5 -122,-15.5 -78.5,-15.5 -78.5,-34.5 -122,-34.5 ; -122,15.5 -122,34.5 -78.5,34.5 -78.5,15.5 -122,15.5 ; -122,65.5 -122,84.5 -78.5,84.5 -78.5,65.5 -122,65.5 ; -122,115.5 -122,134.5 -78.5,134.5 -78.5,115.5 -122,115.5 ; -122,165.5 -122,184.5 -78.5,184.5 -78.5,165.5 -122,165.5 ; -78.5,-221.5 78.5,-221.5 78.5,221.5 -78.5,221.5 -78.5,-221.5 ; 78.5,-184.5 78.5,-165.5 122,-165.5 122,-184.5 78.5,-184.5 ; 78.5,-134.5 78.5,-115.5 122,-115.5 122,-134.5 78.5,-134.5 ; 78.5,-84.5 78.5,-65.5 122,-65.5 122,-84.5 78.5,-84.5 ; 78.5,-34.5 78.5,-15.5 122,-15.5 122,-34.5 78.5,-34.5 ; 78.5,15.5 78.5,34.5 122,34.5 122,15.5 78.5,15.5 ; 78.5,65.5 78.5,84.5 122,84.5 122,65.5 78.5,65.5 ; 78.5,115.5 78.5,134.5 122,134.5 122,115.5 78.5,115.5 ; 78.5,165.5 78.5,184.5 122,184.5 122,165.5 78.5,165.5
  text "*" at -76,168.5 h50
Mechanical 15:
  region: -88.5,-195.5 -146,-195.5 -146,195.5 -88.5,195.5 -88.5,231.5 88.5,231.5 88.5,195.5 146,195.5 146,-195.5 88.5,-195.5 88.5,-231.5 -88.5,-231.5
  lines w6: -146,-195.5 -146,195.5 -88.5,195.5 -88.5,231.5 88.5,231.5 88.5,195.5 146,195.5 146,-195.5 88.5,-195.5 88.5,-231.5 -88.5,-231.5 -88.5,-195.5 -146,-195.5
3D body "HMC1022_HNW.step": height 68.11, standoff 0, extent -122.01,-221.5 122.01,221.5

## HMC1022_HNW-L [mil]
pads (16):
  rect 46x19 smd paste+0 mask+0: 1(-105,175) 2(-105,125) 3(-105,75) 4(-105,25) 5(-105,-25) 6(-105,-75) 7(-105,-125) 8(-105,-175) 9(105,-175) 10(105,-125) 11(105,-75) 12(105,-25) 13(105,25) 14(105,75) 15(105,125) 16(105,175)
Top Overlay:
  region: 138,-117.5 148,-117.5 148,-132.5 138,-132.5
  lines w6: -83.5,-197.6 -83.5,-226.5 83.5,-226.5 83.5,-197.6 ; -83.5,197.6 -83.5,226.5 83.5,226.5 83.5,197.6
  text "*" at -127.5,189 h50
Mechanical 13:
  lines w0: -12,221.5 ccw(c0,221.5) 12,221.5
  lines w1: -122,-184.5 -122,-165.5 -78.5,-165.5 -78.5,-184.5 -122,-184.5 ; -122,-134.5 -122,-115.5 -78.5,-115.5 -78.5,-134.5 -122,-134.5 ; -122,-84.5 -122,-65.5 -78.5,-65.5 -78.5,-84.5 -122,-84.5 ; -122,-34.5 -122,-15.5 -78.5,-15.5 -78.5,-34.5 -122,-34.5 ; -122,15.5 -122,34.5 -78.5,34.5 -78.5,15.5 -122,15.5 ; -122,65.5 -122,84.5 -78.5,84.5 -78.5,65.5 -122,65.5 ; -122,115.5 -122,134.5 -78.5,134.5 -78.5,115.5 -122,115.5 ; -122,165.5 -122,184.5 -78.5,184.5 -78.5,165.5 -122,165.5 ; -78.5,-221.5 78.5,-221.5 78.5,221.5 -78.5,221.5 -78.5,-221.5 ; 78.5,-184.5 78.5,-165.5 122,-165.5 122,-184.5 78.5,-184.5 ; 78.5,-134.5 78.5,-115.5 122,-115.5 122,-134.5 78.5,-134.5 ; 78.5,-84.5 78.5,-65.5 122,-65.5 122,-84.5 78.5,-84.5 ; 78.5,-34.5 78.5,-15.5 122,-15.5 122,-34.5 78.5,-34.5 ; 78.5,15.5 78.5,34.5 122,34.5 122,15.5 78.5,15.5 ; 78.5,65.5 78.5,84.5 122,84.5 122,65.5 78.5,65.5 ; 78.5,115.5 78.5,134.5 122,134.5 122,115.5 78.5,115.5 ; 78.5,165.5 78.5,184.5 122,184.5 122,165.5 78.5,165.5
  text "*" at -76,168.5 h50
Mechanical 15:
  region: -82.5,-188.5 -132,-188.5 -132,188.5 -82.5,188.5 -82.5,225.5 82.5,225.5 82.5,188.5 132,188.5 132,-188.5 82.5,-188.5 82.5,-225.5 -82.5,-225.5
  lines w6: -132,-188.5 -132,188.5 -82.5,188.5 -82.5,225.5 82.5,225.5 82.5,188.5 132,188.5 132,-188.5 82.5,-188.5 82.5,-225.5 -82.5,-225.5 -82.5,-188.5 -132,-188.5
3D body "HMC1022_HNW.step": height 68.11, standoff 0, extent -122.01,-221.5 122.01,221.5

## HMC1022_HNW-M [mil]
pads (16):
  rect 65.5x21 smd paste+0 mask+0: 1(-111.25,175) 2(-111.25,125) 3(-111.25,75) 4(-111.25,25) 5(-111.25,-25) 6(-111.25,-75) 7(-111.25,-125) 8(-111.25,-175) 9(111.25,-175) 10(111.25,-125) 11(111.25,-75) 12(111.25,-25) 13(111.25,25) 14(111.25,75) 15(111.25,125) 16(111.25,175)
Top Overlay:
  region: 154,-117.5 164,-117.5 164,-132.5 154,-132.5
  lines w6: -83.5,-198.6 -83.5,-226.5 83.5,-226.5 83.5,-198.6 ; -83.5,198.6 -83.5,226.5 83.5,226.5 83.5,198.6
  text "*" at -133.75,191 h50
Mechanical 13:
  lines w0: -12,221.5 ccw(c0,221.5) 12,221.5
  lines w1: -122,-184.5 -122,-165.5 -78.5,-165.5 -78.5,-184.5 -122,-184.5 ; -122,-134.5 -122,-115.5 -78.5,-115.5 -78.5,-134.5 -122,-134.5 ; -122,-84.5 -122,-65.5 -78.5,-65.5 -78.5,-84.5 -122,-84.5 ; -122,-34.5 -122,-15.5 -78.5,-15.5 -78.5,-34.5 -122,-34.5 ; -122,15.5 -122,34.5 -78.5,34.5 -78.5,15.5 -122,15.5 ; -122,65.5 -122,84.5 -78.5,84.5 -78.5,65.5 -122,65.5 ; -122,115.5 -122,134.5 -78.5,134.5 -78.5,115.5 -122,115.5 ; -122,165.5 -122,184.5 -78.5,184.5 -78.5,165.5 -122,165.5 ; -78.5,-221.5 78.5,-221.5 78.5,221.5 -78.5,221.5 -78.5,-221.5 ; 78.5,-184.5 78.5,-165.5 122,-165.5 122,-184.5 78.5,-184.5 ; 78.5,-134.5 78.5,-115.5 122,-115.5 122,-134.5 78.5,-134.5 ; 78.5,-84.5 78.5,-65.5 122,-65.5 122,-84.5 78.5,-84.5 ; 78.5,-34.5 78.5,-15.5 122,-15.5 122,-34.5 78.5,-34.5 ; 78.5,15.5 78.5,34.5 122,34.5 122,15.5 78.5,15.5 ; 78.5,65.5 78.5,84.5 122,84.5 122,65.5 78.5,65.5 ; 78.5,115.5 78.5,134.5 122,134.5 122,115.5 78.5,115.5 ; 78.5,165.5 78.5,184.5 122,184.5 122,165.5 78.5,165.5
  text "*" at -76,168.5 h50
Mechanical 15:
  region: -98.5,-205.5 -164,-205.5 -164,205.5 -98.5,205.5 -98.5,241.5 98.5,241.5 98.5,205.5 164,205.5 164,-205.5 98.5,-205.5 98.5,-241.5 -98.5,-241.5
  lines w6: -164,-205.5 -164,205.5 -98.5,205.5 -98.5,241.5 98.5,241.5 98.5,205.5 164,205.5 164,-205.5 98.5,-205.5 98.5,-241.5 -98.5,-241.5 -98.5,-205.5 -164,-205.5
3D body "HMC1022_HNW.step": height 68.11, standoff 0, extent -122.01,-221.5 122.01,221.5